# Altium footprint library Connector_Samtec_HLE_SMD.PcbLib: 290 footprints (part 19 of 24) (continued)
## Samtec_HLE-144-02-xxx-DV-BE-A_2x44_P2.54mm_Horizontal [mm] (continued)
  round 1.78 hole 1.78: Un6(53.34,0) Un58(-53.34,0)
F.SilkS:
  lines w0.12: -55.505,-2.65 -55.99,-2.65 -55.99,2.65 -55.505,2.65 -55.505,3.56 ; -53.715,-2.65 -52.965,-2.65 ; -53.715,2.65 -52.965,2.65 ; -51.175,-2.65 -50.425,-2.65 ; -51.175,2.65 -50.425,2.65 ; -48.635,-2.65 -47.885,-2.65 ; -48.635,2.65 -47.885,2.65 ; -46.095,-2.65 -45.345,-2.65 ; -46.095,2.65 -45.345,2.65 ; -43.555,-2.65 -42.805,-2.65 ; -43.555,2.65 -42.805,2.65 ; -41.015,-2.65 -40.265,-2.65 ; -41.015,2.65 -40.265,2.65 ; -38.475,-2.65 -37.725,-2.65 ; -38.475,2.65 -37.725,2.65 ; -35.935,-2.65 -35.185,-2.65 ; -35.935,2.65 -35.185,2.65 ; -33.395,-2.65 -32.645,-2.65 ; -33.395,2.65 -32.645,2.65 ; -30.855,-2.65 -30.105,-2.65 ; -30.855,2.65 -30.105,2.65 ; -28.315,-2.65 -27.565,-2.65 ; -28.315,2.65 -27.565,2.65 ; -25.775,-2.65 -25.025,-2.65 ; -25.775,2.65 -25.025,2.65 ; -23.235,-2.65 -22.485,-2.65 ; -23.235,2.65 -22.485,2.65 ; -20.695,-2.65 -19.945,-2.65 ; -20.695,2.65 -19.945,2.65 ; -18.155,-2.65 -17.405,-2.65 ; -18.155,2.65 -17.405,2.65 ; -15.615,-2.65 -14.865,-2.65 ; -15.615,2.65 -14.865,2.65 ; -13.075,-2.65 -12.325,-2.65 ; -13.075,2.65 -12.325,2.65 ; -10.535,-2.65 -9.785,-2.65 ; -10.535,2.65 -9.785,2.65 ; -7.995,-2.65 -7.245,-2.65 ; -7.995,2.65 -7.245,2.65 ; -5.455,-2.65 -4.705,-2.65 ; -5.455,2.65 -4.705,2.65 ; -2.915,-2.65 -2.165,-2.65 ; -2.915,2.65 -2.165,2.65 ; -0.375,-2.65 0.375,-2.65 ; -0.375,2.65 0.375,2.65 ; 2.165,-2.65 2.915,-2.65 ; 2.165,2.65 2.915,2.65 ; 4.705,-2.65 5.455,-2.65 ; 4.705,2.65 5.455,2.65 ; 7.245,-2.65 7.995,-2.65 ; 7.245,2.65 7.995,2.65 ; 9.785,-2.65 10.535,-2.65 ; 9.785,2.65 10.535,2.65 ; 12.325,-2.65 13.075,-2.65 ; 12.325,2.65 13.075,2.65 ; 14.865,-2.65 15.615,-2.65 ; 14.865,2.65 15.615,2.65 ; 17.405,-2.65 18.155,-2.65 ; 17.405,2.65 18.155,2.65 ; 19.945,-2.65 20.695,-2.65 ; 19.945,2.65 20.695,2.65 ; 22.485,-2.65 23.235,-2.65 ; 22.485,2.65 23.235,2.65 ; 25.025,-2.65 25.775,-2.65 ; 25.025,2.65 25.775,2.65 ; 27.565,-2.65 28.315,-2.65 ; 27.565,2.65 28.315,2.65 ; 30.105,-2.65 30.855,-2.65 ; 30.105,2.65 30.855,2.65 ; 32.645,-2.65 33.395,-2.65 ; 32.645,2.65 33.395,2.65 ; 35.185,-2.65 35.935,-2.65 ; 35.185,2.65 35.935,2.65 ; 37.725,-2.65 38.475,-2.65 ; 37.725,2.65 38.475,2.65 ; 40.265,-2.65 41.015,-2.65 ; 40.265,2.65 41.015,2.65 ; 42.805,-2.65 43.555,-2.65 ; 42.805,2.65 43.555,2.65 ; 45.345,-2.65 46.095,-2.65 ; 45.345,2.65 46.095,2.65 ; 47.885,-2.65 48.635,-2.65 ; 47.885,2.65 48.635,2.65 ; 50.425,-2.65 51.175,-2.65 ; 50.425,2.65 51.175,2.65 ; 52.965,-2.65 53.715,-2.65 ; 52.965,2.65 53.715,2.65 ; 55.505,-2.65 55.99,-2.65 55.99,2.65 55.505,2.65
F.CrtYd:
  lines w0.05: -56.38,-4.06 56.38,-4.06 56.38,4.06 -56.38,4.06 -56.38,-4.06
F.Fab:
  lines w0.1: -55.11,2.54 -54.61,1.833 -54.11,2.54 ; -55.88,-2.54 55.88,-2.54 55.88,2.54 -55.88,2.54 -55.88,-2.54
  text "'.Designator'" at -4.047,-2.68 h1

## Samtec_HLE-144-02-xxx-DV-BE-LC_2x44_P2.54mm_Horizontal [mm]
pads (178):
  rect 1.27x1.68 smd: 1(-54.61,2.72) 2(-54.61,-2.72) 3(-52.07,2.72) 4(-52.07,-2.72) 5(-49.53,2.72) 6(-49.53,-2.72) 7(-46.99,2.72) 8(-46.99,-2.72) 9(-44.45,2.72) 10(-44.45,-2.72) 11(-41.91,2.72) 12(-41.91,-2.72) 13(-39.37,2.72) 14(-39.37,-2.72) 15(-36.83,2.72) 16(-36.83,-2.72) 17(-34.29,2.72) 18(-34.29,-2.72) 19(-31.75,2.72) 20(-31.75,-2.72) 21(-29.21,2.72) 22(-29.21,-2.72) 23(-26.67,2.72) 24(-26.67,-2.72) 25(-24.13,2.72) 26(-24.13,-2.72) 27(-21.59,2.72) 28(-21.59,-2.72) 29(-19.05,2.72) 30(-19.05,-2.72) 31(-16.51,2.72) 32(-16.51,-2.72) 33(-13.97,2.72) 34(-13.97,-2.72) 35(-11.43,2.72) 36(-11.43,-2.72) 37(-8.89,2.72) 38(-8.89,-2.72) 39(-6.35,2.72) 40(-6.35,-2.72) 41(-3.81,2.72) 42(-3.81,-2.72) 43(-1.27,2.72) 44(-1.27,-2.72) 45(1.27,2.72) 46(1.27,-2.72) 47(3.81,2.72) 48(3.81,-2.72) 49(6.35,2.72) 50(6.35,-2.72) 51(8.89,2.72) 52(8.89,-2.72) 53(11.43,2.72) 54(11.43,-2.72) 55(13.97,2.72) 56(13.97,-2.72) 57(16.51,2.72) 58(16.51,-2.72) 59(19.05,2.72) 60(19.05,-2.72) 61(21.59,2.72) 62(21.59,-2.72) 63(24.13,2.72) 64(24.13,-2.72) 65(26.67,2.72) 66(26.67,-2.72) 67(29.21,2.72) 68(29.21,-2.72) 69(31.75,2.72) 70(31.75,-2.72) 71(34.29,2.72) 72(34.29,-2.72) 73(36.83,2.72) 74(36.83,-2.72) 75(39.37,2.72) 76(39.37,-2.72) 77(41.91,2.72) 78(41.91,-2.72) 79(44.45,2.72) 80(44.45,-2.72) 81(46.99,2.72) 82(46.99,-2.72) 83(49.53,2.72) 84(49.53,-2.72) 85(52.07,2.72) 86(52.07,-2.72) 87(54.61,2.72) 88(54.61,-2.72)
  round 0.97 hole 0.97: Un1(-41.91,-1.27) Un2(6.35,1.27) Un3(31.75,1.27) Un4(52.07,-1.27) Un5(-34.29,-1.27) Un6(54.61,1.27) Un7(29.21,1.27) Un8(44.45,-1.27) Un9(26.67,1.27) Un10(-19.05,1.27) Un11(39.37,1.27) Un12(41.91,-1.27) Un13(-26.67,-1.27) Un14(19.05,1.27) Un15(52.07,1.27) Un16(-19.05,-1.27) Un17(16.51,1.27) Un18(1.27,-1.27) Un19(-24.13,1.27) Un20(24.13,-1.27) Un21(-8.89,1.27) Un22(8.89,1.27) Un23(-3.81,-1.27) Un24(-1.27,-1.27) Un25(49.53,1.27) Un27(6.35,-1.27) Un28(3.81,-1.27) Un29(-11.43,-1.27) Un30(-29.21,-1.27) Un32(-39.37,-1.27) Un33(-6.35,-1.27) Un34(21.59,1.27) Un35(49.53,-1.27) Un36(-39.37,1.27) Un37(-31.75,1.27) Un38(3.81,1.27) Un39(36.83,-1.27) Un40(39.37,-1.27) Un41(-24.13,-1.27) Un42(26.67,-1.27) Un43(-1.27,1.27) Un44(-29.21,1.27) Un45(-54.61,-1.27) Un46(-52.07,-1.27) Un47(54.61,-1.27) Un48(1.27,1.27) Un49(19.05,-1.27) Un50(-36.83,1.27) Un51(-46.99,-1.27) Un52(-3.81,1.27) Un53(-41.91,1.27) Un54(-8.89,-1.27) Un55(41.91,1.27) Un56(-49.53,-1.27) Un57(8.89,-1.27) Un58(-52.07,1.27) Un59(-34.29,1.27) Un60(-13.97,-1.27) Un61(-46.99,1.27) Un62(-6.35,1.27) Un63(29.21,-1.27) Un64(11.43,1.27) Un65(-26.67,1.27) Un66(-11.43,1.27) Un67(34.29,1.27) Un68(-21.59,-1.27) Un69(-16.51,1.27) Un70(-31.75,-1.27) Un71(-13.97,1.27) Un72(34.29,-1.27) Un73(-36.83,-1.27) Un74(46.99,1.27) Un75(13.97,1.27) Un76(-21.59,1.27) Un77(44.45,1.27) Un78(36.83,1.27) Un79(31.75,-1.27) Un80(-54.61,1.27) Un81(-49.53,1.27) Un82(16.51,-1.27) Un83(24.13,1.27) Un84(21.59,-1.27) Un85(-44.45,-1.27) Un86(11.43,-1.27) Un87(46.99,-1.27) Un88(-16.51,-1.27) Un89(13.97,-1.27) Un90(-44.45,1.27)
  round 1.19 hole 1.19: Un26(-53.34,0) Un31(53.34,0)
F.SilkS:
  lines w0.12: -55.505,-2.65 -55.99,-2.65 -55.99,2.65 -55.505,2.65 -55.505,3.56 ; -53.715,-2.65 -52.965,-2.65 ; -53.715,2.65 -52.965,2.65 ; -51.175,-2.65 -50.425,-2.65 ; -51.175,2.65 -50.425,2.65 ; -48.635,-2.65 -47.885,-2.65 ; -48.635,2.65 -47.885,2.65 ; -46.095,-2.65 -45.345,-2.65 ; -46.095,2.65 -45.345,2.65 ; -43.555,-2.65 -42.805,-2.65 ; -43.555,2.65 -42.805,2.65 ; -41.015,-2.65 -40.265,-2.65 ; -41.015,2.65 -40.265,2.65 ; -38.475,-2.65 -37.725,-2.65 ; -38.475,2.65 -37.725,2.65 ; -35.935,-2.65 -35.185,-2.65 ; -35.935,2.65 -35.185,2.65 ; -33.395,-2.65 -32.645,-2.65 ; -33.395,2.65 -32.645,2.65 ; -30.855,-2.65 -30.105,-2.65 ; -30.855,2.65 -30.105,2.65 ; -28.315,-2.65 -27.565,-2.65 ; -28.315,2.65 -27.565,2.65 ; -25.775,-2.65 -25.025,-2.65 ; -25.775,2.65 -25.025,2.65 ; -23.235,-2.65 -22.485,-2.65 ; -23.235,2.65 -22.485,2.65 ; -20.695,-2.65 -19.945,-2.65 ; -20.695,2.65 -19.945,2.65 ; -18.155,-2.65 -17.405,-2.65 ; -18.155,2.65 -17.405,2.65 ; -15.615,-2.65 -14.865,-2.65 ; -15.615,2.65 -14.865,2.65 ; -13.075,-2.65 -12.325,-2.65 ; -13.075,2.65 -12.325,2.65 ; -10.535,-2.65 -9.785,-2.65 ; -10.535,2.65 -9.785,2.65 ; -7.995,-2.65 -7.245,-2.65 ; -7.995,2.65 -7.245,2.65 ; -5.455,-2.65 -4.705,-2.65 ; -5.455,2.65 -4.705,2.65 ; -2.915,-2.65 -2.165,-2.65 ; -2.915,2.65 -2.165,2.65 ; -0.375,-2.65 0.375,-2.65 ; -0.375,2.65 0.375,2.65 ; 2.165,-2.65 2.915,-2.65 ; 2.165,2.65 2.915,2.65 ; 4.705,-2.65 5.455,-2.65 ; 4.705,2.65 5.455,2.65 ; 7.245,-2.65 7.995,-2.65 ; 7.245,2.65 7.995,2.65 ; 9.785,-2.65 10.535,-2.65 ; 9.785,2.65 10.535,2.65 ; 12.325,-2.65 13.075,-2.65 ; 12.325,2.65 13.075,2.65 ; 14.865,-2.65 15.615,-2.65 ; 14.865,2.65 15.615,2.65 ; 17.405,-2.65 18.155,-2.65 ; 17.405,2.65 18.155,2.65 ; 19.945,-2.65 20.695,-2.65 ; 19.945,2.65 20.695,2.65 ; 22.485,-2.65 23.235,-2.65 ; 22.485,2.65 23.235,2.65 ; 25.025,-2.65 25.775,-2.65 ; 25.025,2.65 25.775,2.65 ; 27.565,-2.65 28.315,-2.65 ; 27.565,2.65 28.315,2.65 ; 30.105,-2.65 30.855,-2.65 ; 30.105,2.65 30.855,2.65 ; 32.645,-2.65 33.395,-2.65 ; 32.645,2.65 33.395,2.65 ; 35.185,-2.65 35.935,-2.65 ; 35.185,2.65 35.935,2.65 ; 37.725,-2.65 38.475,-2.65 ; 37.725,2.65 38.475,2.65 ; 40.265,-2.65 41.015,-2.65 ; 40.265,2.65 41.015,2.65 ; 42.805,-2.65 43.555,-2.65 ; 42.805,2.65 43.555,2.65 ; 45.345,-2.65 46.095,-2.65 ; 45.345,2.65 46.095,2.65 ; 47.885,-2.65 48.635,-2.65 ; 47.885,2.65 48.635,2.65 ; 50.425,-2.65 51.175,-2.65 ; 50.425,2.65 51.175,2.65 ; 52.965,-2.65 53.715,-2.65 ; 52.965,2.65 53.715,2.65 ; 55.505,-2.65 55.99,-2.65 55.99,2.65 55.505,2.65
F.CrtYd:
  lines w0.05: -56.38,-4.06 56.38,-4.06 56.38,4.06 -56.38,4.06 -56.38,-4.06
F.Fab:
  lines w0.1: -55.11,2.54 -54.61,1.833 -54.11,2.54 ; -55.88,-2.54 55.88,-2.54 55.88,2.54 -55.88,2.54 -55.88,-2.54
  text "'.Designator'" at -4.047,-2.68 h1

## Samtec_HLE-144-02-xxx-DV-BE_2x44_P2.54mm_Horizontal [mm]
pads (176):
  rect 1.27x1.68 smd: 1(-54.61,2.72) 2(-54.61,-2.72) 3(-52.07,2.72) 4(-52.07,-2.72) 5(-49.53,2.72) 6(-49.53,-2.72) 7(-46.99,2.72) 8(-46.99,-2.72) 9(-44.45,2.72) 10(-44.45,-2.72) 11(-41.91,2.72) 12(-41.91,-2.72) 13(-39.37,2.72) 14(-39.37,-2.72) 15(-36.83,2.72) 16(-36.83,-2.72) 17(-34.29,2.72) 18(-34.29,-2.72) 19(-31.75,2.72) 20(-31.75,-2.72) 21(-29.21,2.72) 22(-29.21,-2.72) 23(-26.67,2.72) 24(-26.67,-2.72) 25(-24.13,2.72) 26(-24.13,-2.72) 27(-21.59,2.72) 28(-21.59,-2.72) 29(-19.05,2.72) 30(-19.05,-2.72) 31(-16.51,2.72) 32(-16.51,-2.72) 33(-13.97,2.72) 34(-13.97,-2.72) 35(-11.43,2.72) 36(-11.43,-2.72) 37(-8.89,2.72) 38(-8.89,-2.72) 39(-6.35,2.72) 40(-6.35,-2.72) 41(-3.81,2.72) 42(-3.81,-2.72) 43(-1.27,2.72) 44(-1.27,-2.72) 45(1.27,2.72) 46(1.27,-2.72) 47(3.81,2.72) 48(3.81,-2.72) 49(6.35,2.72) 50(6.35,-2.72) 51(8.89,2.72) 52(8.89,-2.72) 53(11.43,2.72) 54(11.43,-2.72) 55(13.97,2.72) 56(13.97,-2.72) 57(16.51,2.72) 58(16.51,-2.72) 59(19.05,2.72) 60(19.05,-2.72) 61(21.59,2.72) 62(21.59,-2.72) 63(24.13,2.72) 64(24.13,-2.72) 65(26.67,2.72) 66(26.67,-2.72) 67(29.21,2.72) 68(29.21,-2.72) 69(31.75,2.72) 70(31.75,-2.72) 71(34.29,2.72) 72(34.29,-2.72) 73(36.83,2.72) 74(36.83,-2.72) 75(39.37,2.72) 76(39.37,-2.72) 77(41.91,2.72) 78(41.91,-2.72) 79(44.45,2.72) 80(44.45,-2.72) 81(46.99,2.72) 82(46.99,-2.72) 83(49.53,2.72) 84(49.53,-2.72) 85(52.07,2.72) 86(52.07,-2.72) 87(54.61,2.72) 88(54.61,-2.72)
  round 0.97 hole 0.97: Un1(-36.83,1.27) Un2(24.13,-1.27) Un3(-8.89,-1.27) Un4(41.91,1.27) Un5(52.07,1.27) Un6(16.51,1.27) Un7(-46.99,-1.27) Un8(44.45,-1.27) Un9(-36.83,-1.27) Un10(39.37,-1.27) Un11(-16.51,1.27) Un12(36.83,-1.27) Un13(46.99,-1.27) Un14(-34.29,1.27) Un15(-31.75,-1.27) Un16(1.27,-1.27) Un17(29.21,1.27) Un18(-6.35,1.27) Un19(-1.27,-1.27) Un20(6.35,-1.27) Un21(46.99,1.27) Un22(-13.97,-1.27) Un23(8.89,1.27) Un24(44.45,1.27) Un25(-41.91,-1.27) Un26(11.43,1.27) Un27(-39.37,1.27) Un28(3.81,1.27) Un29(39.37,1.27) Un30(41.91,-1.27) Un31(49.53,1.27) Un32(21.59,-1.27) Un33(-16.51,-1.27) Un34(-21.59,1.27) Un35(31.75,-1.27) Un36(-3.81,-1.27) Un37(52.07,-1.27) Un38(-34.29,-1.27) Un39(-54.61,1.27) Un40(-29.21,1.27) Un41(1.27,1.27) Un42(-1.27,1.27) Un43(-26.67,1.27) Un44(19.05,-1.27) Un45(11.43,-1.27) Un46(-19.05,1.27) Un47(-24.13,-1.27) Un48(8.89,-1.27) Un49(-11.43,-1.27) Un50(-13.97,1.27) Un51(34.29,-1.27) Un52(-29.21,-1.27) Un53(-52.07,1.27) Un54(26.67,1.27) Un55(13.97,1.27) Un56(19.05,1.27) Un57(-11.43,1.27) Un58(24.13,1.27) Un59(-24.13,1.27) Un60(-26.67,-1.27) Un61(21.59,1.27) Un62(-54.61,-1.27) Un63(-49.53,-1.27) Un64(54.61,-1.27) Un65(-6.35,-1.27) Un66(31.75,1.27) Un67(-44.45,-1.27) Un68(6.35,1.27) Un69(29.21,-1.27) Un70(16.51,-1.27) Un71(-39.37,-1.27) Un72(3.81,-1.27) Un73(-49.53,1.27) Un74(36.83,1.27) Un75(-41.91,1.27) Un76(-21.59,-1.27) Un77(-44.45,1.27) Un78(13.97,-1.27) Un79(-3.81,1.27) Un80(-46.99,1.27) Un81(-52.07,-1.27) Un82(34.29,1.27) Un83(49.53,-1.27) Un84(-8.89,1.27) Un85(-19.05,-1.27) Un86(26.67,-1.27) Un87(54.61,1.27) Un88(-31.75,1.27)
F.SilkS:
  lines w0.12: -55.505,-2.65 -55.99,-2.65 -55.99,2.65 -55.505,2.65 -55.505,3.56 ; -53.715,-2.65 -52.965,-2.65 ; -53.715,2.65 -52.965,2.65 ; -51.175,-2.65 -50.425,-2.65 ; -51.175,2.65 -50.425,2.65 ; -48.635,-2.65 -47.885,-2.65 ; -48.635,2.65 -47.885,2.65 ; -46.095,-2.65 -45.345,-2.65 ; -46.095,2.65 -45.345,2.65 ; -43.555,-2.65 -42.805,-2.65 ; -43.555,2.65 -42.805,2.65 ; -41.015,-2.65 -40.265,-2.65 ; -41.015,2.65 -40.265,2.65 ; -38.475,-2.65 -37.725,-2.65 ; -38.475,2.65 -37.725,2.65 ; -35.935,-2.65 -35.185,-2.65 ; -35.935,2.65 -35.185,2.65 ; -33.395,-2.65 -32.645,-2.65 ; -33.395,2.65 -32.645,2.65 ; -30.855,-2.65 -30.105,-2.65 ; -30.855,2.65 -30.105,2.65 ; -28.315,-2.65 -27.565,-2.65 ; -28.315,2.65 -27.565,2.65 ; -25.775,-2.65 -25.025,-2.65 ; -25.775,2.65 -25.025,2.65 ; -23.235,-2.65 -22.485,-2.65 ; -23.235,2.65 -22.485,2.65 ; -20.695,-2.65 -19.945,-2.65 ; -20.695,2.65 -19.945,2.65 ; -18.155,-2.65 -17.405,-2.65 ; -18.155,2.65 -17.405,2.65 ; -15.615,-2.65 -14.865,-2.65 ; -15.615,2.65 -14.865,2.65 ; -13.075,-2.65 -12.325,-2.65 ; -13.075,2.65 -12.325,2.65 ; -10.535,-2.65 -9.785,-2.65 ; -10.535,2.65 -9.785,2.65 ; -7.995,-2.65 -7.245,-2.65 ; -7.995,2.65 -7.245,2.65 ; -5.455,-2.65 -4.705,-2.65 ; -5.455,2.65 -4.705,2.65 ; -2.915,-2.65 -2.165,-2.65 ; -2.915,2.65 -2.165,2.65 ; -0.375,-2.65 0.375,-2.65 ; -0.375,2.65 0.375,2.65 ; 2.165,-2.65 2.915,-2.65 ; 2.165,2.65 2.915,2.65 ; 4.705,-2.65 5.455,-2.65 ; 4.705,2.65 5.455,2.65 ; 7.245,-2.65 7.995,-2.65 ; 7.245,2.65 7.995,2.65 ; 9.785,-2.65 10.535,-2.65 ; 9.785,2.65 10.535,2.65 ; 12.325,-2.65 13.075,-2.65 ; 12.325,2.65 13.075,2.65 ; 14.865,-2.65 15.615,-2.65 ; 14.865,2.65 15.615,2.65 ; 17.405,-2.65 18.155,-2.65 ; 17.405,2.65 18.155,2.65 ; 19.945,-2.65 20.695,-2.65 ; 19.945,2.65 20.695,2.65 ; 22.485,-2.65 23.235,-2.65 ; 22.485,2.65 23.235,2.65 ; 25.025,-2.65 25.775,-2.65 ; 25.025,2.65 25.775,2.65 ; 27.565,-2.65 28.315,-2.65 ; 27.565,2.65 28.315,2.65 ; 30.105,-2.65 30.855,-2.65 ; 30.105,2.65 30.855,2.65 ; 32.645,-2.65 33.395,-2.65 ; 32.645,2.65 33.395,2.65 ; 35.185,-2.65 35.935,-2.65 ; 35.185,2.65 35.935,2.65 ; 37.725,-2.65 38.475,-2.65 ; 37.725,2.65 38.475,2.65 ; 40.265,-2.65 41.015,-2.65 ; 40.265,2.65 41.015,2.65 ; 42.805,-2.65 43.555,-2.65 ; 42.805,2.65 43.555,2.65 ; 45.345,-2.65 46.095,-2.65 ; 45.345,2.65 46.095,2.65 ; 47.885,-2.65 48.635,-2.65 ; 47.885,2.65 48.635,2.65 ; 50.425,-2.65 51.175,-2.65 ; 50.425,2.65 51.175,2.65 ; 52.965,-2.65 53.715,-2.65 ; 52.965,2.65 53.715,2.65 ; 55.505,-2.65 55.99,-2.65 55.99,2.65 55.505,2.65
F.CrtYd:
  lines w0.05: -56.38,-4.06 -56.38,4.06 56.38,4.06 56.38,-4.06 -56.38,-4.06
F.Fab:
  lines w0.1: -55.11,2.54 -54.61,1.833 -54.11,2.54 ; -55.88,-2.54 -55.88,2.54 55.88,2.54 55.88,-2.54 -55.88,-2.54
  text "'.Designator'" at -4.047,-2.68 h1

## Samtec_HLE-144-02-xxx-DV-LC_2x44_P2.54mm_Horizontal [mm]
pads (90):
  rect 1.27x2.29 smd: 1(-54.61,2.525) 2(-54.61,-2.525) 3(-52.07,2.525) 4(-52.07,-2.525) 5(-49.53,2.525) 6(-49.53,-2.525) 7(-46.99,2.525) 8(-46.99,-2.525) 9(-44.45,2.525) 10(-44.45,-2.525) 11(-41.91,2.525) 12(-41.91,-2.525) 13(-39.37,2.525) 14(-39.37,-2.525) 15(-36.83,2.525) 16(-36.83,-2.525) 17(-34.29,2.525) 18(-34.29,-2.525) 19(-31.75,2.525) 20(-31.75,-2.525) 21(-29.21,2.525) 22(-29.21,-2.525) 23(-26.67,2.525) 24(-26.67,-2.525) 25(-24.13,2.525) 26(-24.13,-2.525) 27(-21.59,2.525) 28(-21.59,-2.525) 29(-19.05,2.525) 30(-19.05,-2.525) 31(-16.51,2.525) 32(-16.51,-2.525) 33(-13.97,2.525) 34(-13.97,-2.525) 35(-11.43,2.525) 36(-11.43,-2.525) 37(-8.89,2.525) 38(-8.89,-2.525) 39(-6.35,2.525) 40(-6.35,-2.525) 41(-3.81,2.525) 42(-3.81,-2.525) 43(-1.27,2.525) 44(-1.27,-2.525) 45(1.27,2.525) 46(1.27,-2.525) 47(3.81,2.525) 48(3.81,-2.525) 49(6.35,2.525) 50(6.35,-2.525) 51(8.89,2.525) 52(8.89,-2.525) 53(11.43,2.525) 54(11.43,-2.525) 55(13.97,2.525) 56(13.97,-2.525) 57(16.51,2.525) 58(16.51,-2.525) 59(19.05,2.525) 60(19.05,-2.525) 61(21.59,2.525) 62(21.59,-2.525) 63(24.13,2.525) 64(24.13,-2.525) 65(26.67,2.525) 66(26.67,-2.525) 67(29.21,2.525) 68(29.21,-2.525) 69(31.75,2.525) 70(31.75,-2.525) 71(34.29,2.525) 72(34.29,-2.525) 73(36.83,2.525) 74(36.83,-2.525) 75(39.37,2.525) 76(39.37,-2.525) 77(41.91,2.525) 78(41.91,-2.525) 79(44.45,2.525) 80(44.45,-2.525) 81(46.99,2.525) 82(46.99,-2.525) 83(49.53,2.525) 84(49.53,-2.525) 85(52.07,2.525) 86(52.07,-2.525) 87(54.61,2.525) 88(54.61,-2.525)
  round 1.19 hole 1.19: Un1(-53.34,0) Un2(53.34,0)
F.SilkS:
  lines w0.12: -55.505,-2.65 -55.99,-2.65 -55.99,2.65 -55.505,2.65 -55.505,3.67 ; -53.715,-2.65 -52.965,-2.65 ; -53.715,2.65 -52.965,2.65 ; -51.175,-2.65 -50.425,-2.65 ; -51.175,2.65 -50.425,2.65 ; -48.635,-2.65 -47.885,-2.65 ; -48.635,2.65 -47.885,2.65 ; -46.095,-2.65 -45.345,-2.65 ; -46.095,2.65 -45.345,2.65 ; -43.555,-2.65 -42.805,-2.65 ; -43.555,2.65 -42.805,2.65 ; -41.015,-2.65 -40.265,-2.65 ; -41.015,2.65 -40.265,2.65 ; -38.475,-2.65 -37.725,-2.65 ; -38.475,2.65 -37.725,2.65 ; -35.935,-2.65 -35.185,-2.65 ; -35.935,2.65 -35.185,2.65 ; -33.395,-2.65 -32.645,-2.65 ; -33.395,2.65 -32.645,2.65 ; -30.855,-2.65 -30.105,-2.65 ; -30.855,2.65 -30.105,2.65 ; -28.315,-2.65 -27.565,-2.65 ; -28.315,2.65 -27.565,2.65 ; -25.775,-2.65 -25.025,-2.65 ; -25.775,2.65 -25.025,2.65 ; -23.235,-2.65 -22.485,-2.65 ; -23.235,2.65 -22.485,2.65 ; -20.695,-2.65 -19.945,-2.65 ; -20.695,2.65 -19.945,2.65 ; -18.155,-2.65 -17.405,-2.65 ; -18.155,2.65 -17.405,2.65 ; -15.615,-2.65 -14.865,-2.65 ; -15.615,2.65 -14.865,2.65 ; -13.075,-2.65 -12.325,-2.65 ; -13.075,2.65 -12.325,2.65 ; -10.535,-2.65 -9.785,-2.65 ; -10.535,2.65 -9.785,2.65 ; -7.995,-2.65 -7.245,-2.65 ; -7.995,2.65 -7.245,2.65 ; -5.455,-2.65 -4.705,-2.65 ; -5.455,2.65 -4.705,2.65 ; -2.915,-2.65 -2.165,-2.65 ; -2.915,2.65 -2.165,2.65 ; -0.375,-2.65 0.375,-2.65 ; -0.375,2.65 0.375,2.65 ; 2.165,-2.65 2.915,-2.65 ; 2.165,2.65 2.915,2.65 ; 4.705,-2.65 5.455,-2.65 ; 4.705,2.65 5.455,2.65 ; 7.245,-2.65 7.995,-2.65 ; 7.245,2.65 7.995,2.65 ; 9.785,-2.65 10.535,-2.65 ; 9.785,2.65 10.535,2.65 ; 12.325,-2.65 13.075,-2.65 ; 12.325,2.65 13.075,2.65 ; 14.865,-2.65 15.615,-2.65 ; 14.865,2.65 15.615,2.65 ; 17.405,-2.65 18.155,-2.65 ; 17.405,2.65 18.155,2.65 ; 19.945,-2.65 20.695,-2.65 ; 19.945,2.65 20.695,2.65 ; 22.485,-2.65 23.235,-2.65 ; 22.485,2.65 23.235,2.65 ; 25.025,-2.65 25.775,-2.65 ; 25.025,2.65 25.775,2.65 ; 27.565,-2.65 28.315,-2.65 ; 27.565,2.65 28.315,2.65 ; 30.105,-2.65 30.855,-2.65 ; 30.105,2.65 30.855,2.65 ; 32.645,-2.65 33.395,-2.65 ; 32.645,2.65 33.395,2.65 ; 35.185,-2.65 35.935,-2.65 ; 35.185,2.65 35.935,2.65 ; 37.725,-2.65 38.475,-2.65 ; 37.725,2.65 38.475,2.65 ; 40.265,-2.65 41.015,-2.65 ; 40.265,2.65 41.015,2.65 ; 42.805,-2.65 43.555,-2.65 ; 42.805,2.65 43.555,2.65 ; 45.345,-2.65 46.095,-2.65 ; 45.345,2.65 46.095,2.65 ; 47.885,-2.65 48.635,-2.65 ; 47.885,2.65 48.635,2.65 ; 50.425,-2.65 51.175,-2.65 ; 50.425,2.65 51.175,2.65 ; 52.965,-2.65 53.715,-2.65 ; 52.965,2.65 53.715,2.65 ; 55.505,-2.65 55.99,-2.65 55.99,2.65 55.505,2.65
F.CrtYd:
  lines w0.05: -56.38,-4.17 56.38,-4.17 56.38,4.17 -56.38,4.17 -56.38,-4.17
F.Fab:
  lines w0.1: -55.11,2.54 -54.61,1.833 -54.11,2.54 ; -55.88,-2.54 55.88,-2.54 55.88,2.54 -55.88,2.54 -55.88,-2.54
  text "'.Designator'" at -4.047,-2.68 h1

## Samtec_HLE-144-02-xxx-DV_2x44_P2.54mm_Horizontal [mm]
pads (88):
  rect 1.27x2.29 smd: 1(-54.61,2.525) 2(-54.61,-2.525) 3(-52.07,2.525) 4(-52.07,-2.525) 5(-49.53,2.525) 6(-49.53,-2.525) 7(-46.99,2.525) 8(-46.99,-2.525) 9(-44.45,2.525) 10(-44.45,-2.525) 11(-41.91,2.525) 12(-41.91,-2.525) 13(-39.37,2.525) 14(-39.37,-2.525) 15(-36.83,2.525) 16(-36.83,-2.525) 17(-34.29,2.525) 18(-34.29,-2.525) 19(-31.75,2.525) 20(-31.75,-2.525) 21(-29.21,2.525) 22(-29.21,-2.525) 23(-26.67,2.525) 24(-26.67,-2.525) 25(-24.13,2.525) 26(-24.13,-2.525) 27(-21.59,2.525) 28(-21.59,-2.525) 29(-19.05,2.525) 30(-19.05,-2.525) 31(-16.51,2.525) 32(-16.51,-2.525) 33(-13.97,2.525) 34(-13.97,-2.525) 35(-11.43,2.525) 36(-11.43,-2.525) 37(-8.89,2.525) 38(-8.89,-2.525) 39(-6.35,2.525) 40(-6.35,-2.525) 41(-3.81,2.525) 42(-3.81,-2.525) 43(-1.27,2.525) 44(-1.27,-2.525) 45(1.27,2.525) 46(1.27,-2.525) 47(3.81,2.525) 48(3.81,-2.525) 49(6.35,2.525) 50(6.35,-2.525) 51(8.89,2.525) 52(8.89,-2.525) 53(11.43,2.525) 54(11.43,-2.525) 55(13.97,2.525) 56(13.97,-2.525) 57(16.51,2.525) 58(16.51,-2.525) 59(19.05,2.525) 60(19.05,-2.525) 61(21.59,2.525) 62(21.59,-2.525) 63(24.13,2.525) 64(24.13,-2.525) 65(26.67,2.525) 66(26.67,-2.525) 67(29.21,2.525) 68(29.21,-2.525) 69(31.75,2.525) 70(31.75,-2.525) 71(34.29,2.525) 72(34.29,-2.525) 73(36.83,2.525) 74(36.83,-2.525) 75(39.37,2.525) 76(39.37,-2.525) 77(41.91,2.525) 78(41.91,-2.525) 79(44.45,2.525) 80(44.45,-2.525) 81(46.99,2.525) 82(46.99,-2.525) 83(49.53,2.525) 84(49.53,-2.525) 85(52.07,2.525) 86(52.07,-2.525) 87(54.61,2.525) 88(54.61,-2.525)
F.SilkS:
  lines w0.12: -55.505,-2.65 -55.99,-2.65 -55.99,2.65 -55.505,2.65 -55.505,3.67 ; -53.715,-2.65 -52.965,-2.65 ; -53.715,2.65 -52.965,2.65 ; -51.175,-2.65 -50.425,-2.65 ; -51.175,2.65 -50.425,2.65 ; -48.635,-2.65 -47.885,-2.65 ; -48.635,2.65 -47.885,2.65 ; -46.095,-2.65 -45.345,-2.65 ; -46.095,2.65 -45.345,2.65 ; -43.555,-2.65 -42.805,-2.65 ; -43.555,2.65 -42.805,2.65 ; -41.015,-2.65 -40.265,-2.65 ; -41.015,2.65 -40.265,2.65 ; -38.475,-2.65 -37.725,-2.65 ; -38.475,2.65 -37.725,2.65 ; -35.935,-2.65 -35.185,-2.65 ; -35.935,2.65 -35.185,2.65 ; -33.395,-2.65 -32.645,-2.65 ; -33.395,2.65 -32.645,2.65 ; -30.855,-2.65 -30.105,-2.65 ; -30.855,2.65 -30.105,2.65 ; -28.315,-2.65 -27.565,-2.65 ; -28.315,2.65 -27.565,2.65 ; -25.775,-2.65 -25.025,-2.65 ; -25.775,2.65 -25.025,2.65 ; -23.235,-2.65 -22.485,-2.65 ; -23.235,2.65 -22.485,2.65 ; -20.695,-2.65 -19.945,-2.65 ; -20.695,2.65 -19.945,2.65 ; -18.155,-2.65 -17.405,-2.65 ; -18.155,2.65 -17.405,2.65 ; -15.615,-2.65 -14.865,-2.65 ; -15.615,2.65 -14.865,2.65 ; -13.075,-2.65 -12.325,-2.65 ; -13.075,2.65 -12.325,2.65 ; -10.535,-2.65 -9.785,-2.65 ; -10.535,2.65 -9.785,2.65 ; -7.995,-2.65 -7.245,-2.65 ; -7.995,2.65 -7.245,2.65 ; -5.455,-2.65 -4.705,-2.65 ; -5.455,2.65 -4.705,2.65 ; -2.915,-2.65 -2.165,-2.65 ; -2.915,2.65 -2.165,2.65 ; -0.375,-2.65 0.375,-2.65 ; -0.375,2.65 0.375,2.65 ; 2.165,-2.65 2.915,-2.65 ; 2.165,2.65 2.915,2.65 ; 4.705,-2.65 5.455,-2.65 ; 4.705,2.65 5.455,2.65 ; 7.245,-2.65 7.995,-2.65 ; 7.245,2.65 7.995,2.65 ; 9.785,-2.65 10.535,-2.65 ; 9.785,2.65 10.535,2.65 ; 12.325,-2.65 13.075,-2.65 ; 12.325,2.65 13.075,2.65 ; 14.865,-2.65 15.615,-2.65 ; 14.865,2.65 15.615,2.65 ; 17.405,-2.65 18.155,-2.65 ; 17.405,2.65 18.155,2.65 ; 19.945,-2.65 20.695,-2.65 ; 19.945,2.65 20.695,2.65 ; 22.485,-2.65 23.235,-2.65 ; 22.485,2.65 23.235,2.65 ; 25.025,-2.65 25.775,-2.65 ; 25.025,2.65 25.775,2.65 ; 27.565,-2.65 28.315,-2.65 ; 27.565,2.65 28.315,2.65 ; 30.105,-2.65 30.855,-2.65 ; 30.105,2.65 30.855,2.65 ; 32.645,-2.65 33.395,-2.65 ; 32.645,2.65 33.395,2.65 ; 35.185,-2.65 35.935,-2.65 ; 35.185,2.65 35.935,2.65 ; 37.725,-2.65 38.475,-2.65 ; 37.725,2.65 38.475,2.65 ; 40.265,-2.65 41.015,-2.65 ; 40.265,2.65 41.015,2.65 ; 42.805,-2.65 43.555,-2.65 ; 42.805,2.65 43.555,2.65 ; 45.345,-2.65 46.095,-2.65 ; 45.345,2.65 46.095,2.65 ; 47.885,-2.65 48.635,-2.65 ; 47.885,2.65 48.635,2.65 ; 50.425,-2.65 51.175,-2.65 ; 50.425,2.65 51.175,2.65 ; 52.965,-2.65 53.715,-2.65 ; 52.965,2.65 53.715,2.65 ; 55.505,-2.65 55.99,-2.65 55.99,2.65 55.505,2.65
F.CrtYd:
  lines w0.05: -56.38,-4.17 56.38,-4.17 56.38,4.17 -56.38,4.17 -56.38,-4.17
F.Fab:
  lines w0.1: -55.11,2.54 -54.61,1.833 -54.11,2.54 ; -55.88,-2.54 55.88,-2.54 55.88,2.54 -55.88,2.54 -55.88,-2.54
  text "'.Designator'" at -4.047,-2.68 h1